# Altium schematic symbol library TI - ADC.SchLib: 2198 symbols (part 81 of 130) (continued)
## AFE5808ZCF (continued)
part D pins: A1 AVDD (power) "3.3V Analog supply for LNA, VCAT, PGA, LPF and CWD blocks.", C1 AVSS (power) "Analog ground.", D1 AVSS (power) "Analog ground.", D2 AVSS (power) "Analog ground.", D3 AVSS (power) "Analog ground.", D4 AVSS (power) "Analog ground.", D5 AVSS (power) "Analog ground.", D6 AVSS (power) "Analog ground.", D7 AVSS (power) "Analog ground.", D8 AVDD (power) "3.3V Analog supply for LNA, VCAT, PGA, LPF and CWD blocks.", D9 AVDD (power) "3.3V Analog supply for LNA, VCAT, PGA, LPF and CWD blocks.", E3 AVSS (power) "Analog ground.", E4 AVSS (power) "Analog ground.", E5 AVSS (power) "Analog ground.", E6 AVSS (power) "Analog ground.", E7 AVSS (power) "Analog ground.", E8 AVDD (power) "3.3V Analog supply for LNA, VCAT, PGA, LPF and CWD blocks.", E9 AVDD (power) "3.3V Analog supply for LNA, VCAT, PGA, LPF and CWD blocks.", F3 AVSS (power) "Analog ground.", F4 AVSS (power) "Analog ground.", F5 AVSS (power) "Analog ground.", F6 AVSS (power) "Analog ground.", F7 AVSS (power) "Analog ground.", G1 AVSS (power) "Analog ground.", G2 AVSS (power) "Analog ground.", G3 AVSS (power) "Analog ground.", G4 AVSS (power) "Analog ground.", G5 AVSS (power) "Analog ground.", G6 AVSS (power) "Analog ground.", G7 AVSS (power) "Analog ground.", H3 AVSS (power) "Analog ground.", H4 AVSS (power) "Analog ground.", H5 AVSS (power) "Analog ground.", H6 AVSS (power) "Analog ground.", H7 AVSS (power) "Analog ground.", J3 AVSS (power) "Analog ground.", J4 AVSS (power) "Analog ground.", J5 AVSS (power) "Analog ground.", J6 AVDD_ADC (power) "1.8V Analog power supply for ADC.", J7 AVDD_ADC (power) "1.8V Analog power supply for ADC.", K1 AVDD (power) "3.3V Analog supply for LNA, VCAT, PGA, LPF and CWD blocks.", K2 AVDD_5V (power) "5V Analog supply for LNA, VCAT, PGA, LPF and CWD blocks.", K6 AVSS (power) "Analog ground.", K7 DNC "Do not connect. Must leave floated", K8 AVDD_ADC (power) "1.8V Analog power supply for ADC.", L3 AVDD_ADC (power) "1.8V Analog power supply for ADC.", L5 DNC "Do not connect. Must leave floated", L6 DNC "Do not connect. Must leave floated", L7 DNC "Do not connect. Must leave floated", M1 AVDD_ADC (power) "1.8V Analog power supply for ADC.", M2 AVDD_ADC (power) "1.8V Analog power supply for ADC.", M5 DNC "Do not connect. Must leave floated", M6 DNC "Do not connect. Must leave floated", M7 DNC "Do not connect. Must leave floated", M8 DNC "Do not connect. Must leave floated", N3 DVDD (power) "ADC digital and I/O power supply, 1.8V", N4 DNC "Do not connect. Must leave floated", N5 DVSS (power) "ADC digital ground", N6 DNC "Do not connect. Must leave floated", N7 DVDD (power) "ADC digital and I/O power supply, 1.8V", P5 DVSS (power) "ADC digital ground", R5 DVSS (power) "ADC digital ground"

## AFE5851IRGCR
designator U?
16-Channel VGA with ADC, -40 to 85 degC, 64-pin QFN (RGC64), Green (RoHS & no Sb/Br); Manufacturer: Texas Instruments; PartNumber: AFE5851IRGCR; # Input Channels: 16; Analog Voltage AV/DD(Max)(V): 3.6; Analog Voltage AV/DD(Min)(V): 1.7; Digital Supply(Max)(V): 1.9; Resolution(Bits): 12; Sample Rate (max)(SPS): 65M; SFDR(dB): 55; SNR(dB): 66; SubFamily: High Speed ADC (>10MSPS); DatasheetVersion: SLOS574B; PackageVersion: 4204106/F, 11/2011; PackageReference: RGC64-7400X7400TP; PackageDescription: 64-Pin Plastic Quad Flatpack No-Lead, Body 9 x 9 mm, Pitch 0.5 mm; Supplier 1: Digi-Key; Supplier Part Number 1: ADS1210U/1KG4-ND; Digital Supply(Min)(V): 1.7; Eco-Plan: Green (RoHS & no Sb/Br); Mounting Technology: Surface Mount; ComponentLink1Description: Manufacturer URL; ComponentLink1URL: http://www.ti.com/; ComponentLink2Description: Datasheet; ComponentLink2URL: http://www.ti.com/general/docs/lit/getliterature.tsp?genericPartNumber=AFE5851&fileType=pdf; ComponentLink3Description: Package Specification; ComponentLink3URL: http://www.ti.com/litv/pdf/mpqf125e
footprint TI-RGC64-7400X7400TP_V (QFN, 64-Leads, Body 9x9mm, Pitch 0.5mm, Thermal Pad 7.4x7.4mm, TI Recommended)
part A pins: 1 IN1 (in) "Single-ended analog input pins for channel 1 to 16.", 2 IN2 (in) "Single-ended analog input pins for channel 1 to 16.", 3 IN3 (in) "Single-ended analog input pins for channel 1 to 16.", 4 IN4 (in) "Single-ended analog input pins for channel 1 to 16.", 5 IN5 (in) "Single-ended analog input pins for channel 1 to 16.", 6 IN6 (in) "Single-ended analog input pins for channel 1 to 16.", 7 IN7 (in) "Single-ended analog input pins for channel 1 to 16.", 8 IN8 (in) "Single-ended analog input pins for channel 1 to 16.", 9 IN9 (in) "Single-ended analog input pins for channel 1 to 16.", 10 IN10 (in) "Single-ended analog input pins for channel 1 to 16.", 11 IN11 (in) "Single-ended analog input pins for channel 1 to 16.", 12 IN12 (in) "Single-ended analog input pins for channel 1 to 16.", 13 IN13 (in) "Single-ended analog input pins for channel 1 to 16.", 14 IN14 (in) "Single-ended analog input pins for channel 1 to 16.", 15 IN15 (in) "Single-ended analog input pins for channel 1 to 16.", 16 IN16 (in) "Single-ended analog input pins for channel 1 to 16.", 17 VCM (out) "Common-mode output pins for possible bias of the analog input signals", 21 CLKINP (in) "Differential clock input pins. Single-ended clock is also supported. See the Clock Inputs section.", 22 CLKINM (in) "Differential clock input pins. Single-ended clock is also supported. See the Clock Inputs section.", 25 VREF_IN (in) "Reference input in the external reference mode", 26 NC "Do not connect", 27 NC "Do not connect", 31 D8M (hiz) "LVDS output for channels 1 and 2, 3 and 4, 5 and 6.... to 15 and 16.", 32 D8P (hiz) "LVDS output for channels 1 and 2, 3 and 4, 5 and 6.... to 15 and 16.", 33 D7M (hiz) "LVDS output for channels 1 and 2, 3 and 4, 5 and 6.... to 15 and 16.", 34 D7P (hiz) "LVDS output for channels 1 and 2, 3 and 4, 5 and 6.... to 15 and 16.", 35 D6M (hiz) "LVDS output for channels 1 and 2, 3 and 4, 5 and 6.... to 15 and 16.", 36 D6P (hiz) "LVDS output for channels 1 and 2, 3 and 4, 5 and 6.... to 15 and 16.", 37 D5M (hiz) "LVDS output for channels 1 and 2, 3 and 4, 5 and 6.... to 15 and 16.", 38 D5P (hiz) "LVDS output for channels 1 and 2, 3 and 4, 5 and 6.... to 15 and 16.", 39 FCLKM (out) "LVDS frame clock output", 40 FCLKP (out) "LVDS frame clock output", 41 DCLKM (out) "LVDS bit clock output", 42 DCLKP (out) "LVDS bit clock output", 43 D4M (hiz) "LVDS output for channels 1 and 2, 3 and 4, 5 and 6.... to 15 and 16.", 44 D4P (hiz) "LVDS output for channels 1 and 2, 3 and 4, 5 and 6.... to 15 and 16.", 45 D3M (hiz) "LVDS output for channels 1 and 2, 3 and 4, 5 and 6.... to 15 and 16.", 46 D3P (hiz) "LVDS output for channels 1 and 2, 3 and 4, 5 and 6.... to 15 and 16.", 47 D2M (hiz) "LVDS output for channels 1 and 2, 3 and 4, 5 and 6.... to 15 and 16.", 48 D2P (hiz) "LVDS output for channels 1 and 2, 3 and 4, 5 and 6.... to 15 and 16.", 49 D1M (hiz) "LVDS output for channels 1 and 2, 3 and 4, 5 and 6.... to 15 and 16.", 50 D1P (hiz) "LVDS output for channels 1 and 2, 3 and 4, 5 and 6.... to 15 and 16.", 53 SDOUT (out) "Serial interface data readout", 54 ~{SEN} (in) "Serial interface enable. 100kohm pullup resistor", 55 SDATA (in) "Serial interface data input. 100kohm pulldown resistor", 56 SCLK (in) "Serial interface clock input. 100kohm pulldown resistor", 57 RESET (in) "Hardware reset pin (active-high). 100kohm pulldown resistor", 58 SYNC (in) "TGC/VGA synchronization signal input. 100kohm pulldown resistor", 59 PDN (in) "Global power-down control input (active-high). 100kohm pulldown resistor", 60 NC "Do not connect", 64 VCM (out) "Common-mode output pins for possible bias of the analog input signals"
part B pins: 18 AVDD3 (power) "3.3V analog supply voltage", 19 AVDD18 (power) "1.8V analog supply voltage", 20 AVSS (power) "Analog ground", 23 AVSS (power) "Analog ground", 24 AVDD18 (power) "1.8V analog supply voltage", 28 DVDD18 (power) "1.8V LVDS buffer supply voltage", 29 DVSS (power) "Digital ground", 30 DVDD18 (power) "1.8V LVDS buffer supply voltage", 51 DVDD18 (power) "1.8V LVDS buffer supply voltage", 52 DVSS (power) "Digital ground", 61 AVSS (power) "Analog ground", 62 AVDD18 (power) "1.8V analog supply voltage", 63 AVSS (power) "Analog ground", 65 EP (power) "Connect to AVSS"

## AMC1200BDWVR
designator U?
IC ISOLATION AMP 60KHZ 8SOIC; Manufacturer: Texas Instruments; Number of Circuits: 1; Output Type: Differential; -3db Bandwidth: 100kHz; Voltage - Input Offset: 200µV; Current - Supply: 5.4mA; Current - Output / Channel: 20mA; Voltage - Supply, Single/Dual (±): 2.7 V ~ 5.5 V; Supplier 1: Digi-Key; Manufacturer Part Number: AMC1200BDWVR; RoHS: RoHS Compliant; Category: Integrated Circuits (ICs); Stock 1: 3983; Pricing 1: 1=5.41, 10=4.851, 100=3.9798, 500=3.3858, 1000=2.475 (USD); Packaging: Cut Tape (CT); Part Status: Active; Amplifier Type: Isolation; Slew Rate: -; Gain Bandwidth Product: -; Current - Input Bias: -; Operating Temperature: -40°C ~ 105°C; Mounting Type: Surface Mount; Package / Case: 8-SOIC (0.295", 7.50mm Width); Supplier Device Package: 8-SOIC; ComponentLink1URL: http://www.ti.com/lit/ds/symlink/amc1200.pdf; ComponentLink1Description: http://www.ti.com/lit/ds/symlink/amc1200.pdf; Value: AMC1200BDWVR; Supplier Part Number 1: 296-39898-1-ND
footprint SOIC8_5.8_7.5 (SOIC, 8-Leads, Body 5,85x7,50mm, Pitch 1,27mm, IPC Medium Density)
pins: 1 VDD1 (power) "High-side power supply", 2 VINP (in) "Noninverting analog input", 3 VINN (in) "Inverting analog input", 4 GND1 (power) "High-side analog ground", 5 GND2 (power) "Low-side analog ground", 6 VOUTN (out) "Inverting analog output", 7 VOUTP (out) "Noninverting analog output", 8 VDD2 (power) "Low-side power supply"

## AMC1200SDUB
designator U?
4 kV Peak Isolated Amplifier for Current Shunt Measurements, -40 to 125 degC, 8-pin SOP (DUB8), Green (RoHS & no Sb/Br); Manufacturer: Texas Instruments; PartNumber: AMC1200SDUB; # Input Channels: 1; Analog Voltage AV/DD(Max)(V): 5.5; Analog Voltage AV/DD(Min)(V): 4.5; Architecture: Delta-Sigma, Modulator; Digital Supply(Min)(V): 2.7; SubFamily: Isolated Precision ADC (<=10MSPS); DatasheetVersion: SBAS542B; PackageVersion: 4207614/C, 05/2006; PackageReference: DUB8; PackageDescription: 8-Pin Plastic Small Outline, Body 9.5 x 6.62 mm, Pitch 2.54 mm; Supplier 1: Digi-Key; Supplier Part Number 1: ADS1210UG4-ND; Digital Supply(Max)(V): 5.5; Eco-Plan: Green (RoHS & no Sb/Br); Mounting Technology: Surface Mount; ComponentLink1Description: Manufacturer URL; ComponentLink1URL: http://www.ti.com/; ComponentLink2Description: Datasheet; ComponentLink2URL: http://www.ti.com/general/docs/lit/getliterature.tsp?genericPartNumber=AMC1200&fileType=pdf; ComponentLink3Description: Package Specification; ComponentLink3URL: http://www.ti.com/lit/ml/mpds247b/mpds247b.pdf
footprint TI-DUB8_N (SOP, 8-Leads, Body 9.5x6.62mm, Pitch 2.54mm, IPC Medium Density)
footprint TI-DUB8_L (SOP, 8-Leads, Body 9.5x6.62mm, Pitch 2.54mm, IPC High Density)
footprint TI-DUB8_M (SOP, 8-Leads, Body 9.5x6.62mm, Pitch 2.54mm, IPC Low Density)
pins: 1 VDD1 (power) "High-side power supply", 2 VINP (in) "Noninverting analog input", 3 VINN (in) "Inverting analog input", 4 GND1 (power) "High-side analog ground", 5 GND2 (power) "Low-side analog ground", 6 VOUTN (out) "Inverting analog output", 7 VOUTP (out) "Noninverting analog output", 8 VDD2 (power) "Low-side power supply"

## AMC1200SDUBR
designator U?
4 kV Peak Isolated Amplifier for Current Shunt Measurements, -40 to 125 degC, 8-pin SOP (DUB8), Green (RoHS & no Sb/Br); Manufacturer: Texas Instruments; PartNumber: AMC1200SDUBR; # Input Channels: 1; Analog Voltage AV/DD(Max)(V): 5.5; Analog Voltage AV/DD(Min)(V): 4.5; Architecture: Delta-Sigma, Modulator; Digital Supply(Min)(V): 2.7; SubFamily: Isolated Precision ADC (<=10MSPS); DatasheetVersion: SBAS542B; PackageVersion: 4207614/C, 05/2006; PackageReference: DUB8; PackageDescription: 8-Pin Plastic Small Outline, Body 9.5 x 6.62 mm, Pitch 2.54 mm; Supplier 1: Digi-Key; Supplier Part Number 1: ADS800U-ND; Digital Supply(Max)(V): 5.5; Eco-Plan: Green (RoHS & no Sb/Br); Mounting Technology: Surface Mount; ComponentLink1Description: Manufacturer URL; ComponentLink1URL: http://www.ti.com/; ComponentLink2Description: Datasheet; ComponentLink2URL: http://www.ti.com/general/docs/lit/getliterature.tsp?genericPartNumber=AMC1200&fileType=pdf; ComponentLink3Description: Package Specification; ComponentLink3URL: http://www.ti.com/lit/ml/mpds247b/mpds247b.pdf
footprint TI-DUB8_N (SOP, 8-Leads, Body 9.5x6.62mm, Pitch 2.54mm, IPC Medium Density)
footprint TI-DUB8_L (SOP, 8-Leads, Body 9.5x6.62mm, Pitch 2.54mm, IPC High Density)
footprint TI-DUB8_M (SOP, 8-Leads, Body 9.5x6.62mm, Pitch 2.54mm, IPC Low Density)
pins: 1 VDD1 (power) "High-side power supply", 2 VINP (in) "Noninverting analog input", 3 VINN (in) "Inverting analog input", 4 GND1 (power) "High-side analog ground", 5 GND2 (power) "Low-side analog ground", 6 VOUTN (out) "Inverting analog output", 7 VOUTP (out) "Noninverting analog output", 8 VDD2 (power) "Low-side power supply"

## AMC1204DW
designator U?
1-Bit, 20 MHz, 2nd-Order, Isolated Delta-Sigma Modulator, -40 to 125 degC, 16-pin SOIC (DW16), Green (RoHS & no Sb/Br); Manufacturer: Texas Instruments; PartNumber: AMC1204DW; # Input Channels: 1; Analog Voltage AV/DD(Max)(V): 5.5; Analog Voltage AV/DD(Min)(V): 4.5; Architecture: Delta-Sigma, Modulator; Digital Supply(Min)(V): 3; INL(Max)(+/-LSB): 8; Interface: Serial; Resolution(Bits): 16; Sample Rate (max)(SPS): 78k; SFDR(dB): 96; SINAD(dB): 87; SNR(dB): 88; SubFamily: Isolated Precision ADC (<=10MSPS); DatasheetVersion: SBAS512C; PackageVersion: 4040000-2/G, 01/2011; PackageReference: DW16; PackageDescription: 16-Pin Plastic Small Outline, Body 10.30 x 7.50 mm, Pitch 1.27 mm; Supplier 1: Digi-Key; Supplier Part Number 1: ADS800U/1K-ND; Digital Supply(Max)(V): 5.5; Eco-Plan: Green (RoHS & no Sb/Br); Mounting Technology: Surface Mount; Code_JEDEC: MS-013; ComponentLink1Description: Manufacturer URL; ComponentLink1URL: http://www.ti.com/; ComponentLink2Description: Datasheet; ComponentLink2URL: http://www.ti.com/general/docs/lit/getliterature.tsp?genericPartNumber=AMC1204&fileType=pdf; ComponentLink3Description: Package Specification; ComponentLink3URL: http://www.ti.com/litv/pdf/msoi003g
footprint TI-DW16_N (SOIC, 16-Leads, Body 10.3x7.5mm, Pitch 1.27mm, IPC Medium Density)
footprint TI-DW16_L (SOIC, 16-Leads, Body 10.3x7.5mm, Pitch 1.27mm, IPC High Density)
footprint TI-DW16_M (SOIC, 16-Leads, Body 10.3x7.5mm, Pitch 1.27mm, IPC Low Density)
part A pins: 1 AVDD (power) "High-side power supply", 2 VINP (in) "Noninverting analog input", 3 VINN (in) "Inverting analog input", 4 AGND (power) "High-side ground", 8 AGND (power) "High-side ground", 9 DGND (power) "Controller-side ground", 11 DATA (hiz) "Modulator data output", 13 CLKIN (in) "Modulator clock input", 14 DVDD (power) "Controller-side power supply", 16 DGND (power) "Controller-side ground"
part B pins: 5 NC "No internal connection; can be tied to any potential or left unconnected", 6 NC "No internal connection; can be tied to any potential or left unconnected", 7 NC "No internal connection; can be tied to any potential or left unconnected", 10 NC "No internal connection; can be tied to any potential or left unconnected", 12 NC "No internal connection; can be tied to any potential or left unconnected", 15 NC "No internal connection; can be tied to any potential or left unconnected"

## AMC1204DWR
designator U?
1-Bit, 20 MHz, 2nd-Order, Isolated Delta-Sigma Modulator, -40 to 125 degC, 16-pin SOIC (DW16), Green (RoHS & no Sb/Br); Manufacturer: Texas Instruments; PartNumber: AMC1204DWR; # Input Channels: 1; Analog Voltage AV/DD(Max)(V): 5.5; Analog Voltage AV/DD(Min)(V): 4.5; Architecture: Delta-Sigma, Modulator; Digital Supply(Min)(V): 3; INL(Max)(+/-LSB): 8; Interface: Serial; Resolution(Bits): 16; Sample Rate (max)(SPS): 78k; SFDR(dB): 96; SINAD(dB): 87; SNR(dB): 88; SubFamily: Isolated Precision ADC (<=10MSPS); DatasheetVersion: SBAS512C; PackageVersion: 4040000-2/G, 01/2011; PackageReference: DW16; PackageDescription: 16-Pin Plastic Small Outline, Body 10.30 x 7.50 mm, Pitch 1.27 mm; Supplier 1: Digi-Key; Supplier Part Number 1: ADS800U/1KG4-ND; Digital Supply(Max)(V): 5.5; Eco-Plan: Green (RoHS & no Sb/Br); Mounting Technology: Surface Mount; Code_JEDEC: MS-013; ComponentLink1Description: Manufacturer URL; ComponentLink1URL: http://www.ti.com/; ComponentLink2Description: Datasheet; ComponentLink2URL: http://www.ti.com/general/docs/lit/getliterature.tsp?genericPartNumber=AMC1204&fileType=pdf; ComponentLink3Description: Package Specification; ComponentLink3URL: http://www.ti.com/litv/pdf/msoi003g
footprint TI-DW16_N (SOIC, 16-Leads, Body 10.3x7.5mm, Pitch 1.27mm, IPC Medium Density)
footprint TI-DW16_L (SOIC, 16-Leads, Body 10.3x7.5mm, Pitch 1.27mm, IPC High Density)
footprint TI-DW16_M (SOIC, 16-Leads, Body 10.3x7.5mm, Pitch 1.27mm, IPC Low Density)
part A pins: 1 AVDD (power) "High-side power supply", 2 VINP (in) "Noninverting analog input", 3 VINN (in) "Inverting analog input", 4 AGND (power) "High-side ground", 8 AGND (power) "High-side ground", 9 DGND (power) "Controller-side ground", 11 DATA (hiz) "Modulator data output", 13 CLKIN (in) "Modulator clock input", 14 DVDD (power) "Controller-side power supply", 16 DGND (power) "Controller-side ground"
part B pins: 5 NC "No internal connection; can be tied to any potential or left unconnected", 6 NC "No internal connection; can be tied to any potential or left unconnected", 7 NC "No internal connection; can be tied to any potential or left unconnected", 10 NC "No internal connection; can be tied to any potential or left unconnected", 12 NC "No internal connection; can be tied to any potential or left unconnected", 15 NC "No internal connection; can be tied to any potential or left unconnected"

## AMC1204QDWRQ1
designator U?
Automotive Catalog, 1-Bit, 20 MHz, 2nd-Order, Isolated Delta-Sigma Modulator, -40 to 125 degC, 16-pin SOIC (DW16), Green (RoHS & no Sb/Br); Manufacturer: Texas Instruments; PartNumber: AMC1204QDWRQ1; # Input Channels: 1; Analog Voltage AV/DD(Max)(V): 5.5; Analog Voltage AV/DD(Min)(V): 4.5; Architecture: Delta-Sigma, Modulator; Digital Supply(Min)(V): 2.7; INL(Max)(+/-LSB): 16; Interface: Serial; Sample Rate(max)(SPS): 78k; SFDR(dB): 96; SINAD(dB): 87; SNR(dB): 88; SubFamily: Isolated ADC; DatasheetVersion: SLAS886B; PackageVersion: 4040000-2/G, 01/2011; PackageReference: DW16; PackageDescription: 16-Pin Plastic Small Outline, Body 10.30 x 7.50 mm, Pitch 1.27 mm; Supplier 1: Digi-Key; Supplier Part Number 1: ADS800UG4-ND; Digital Supply(Max)(V): 5.5; Eco-Plan: Green (RoHS & no Sb/Br); Resolution(Bits): 16; Mounting Technology: Surface Mount; Code_JEDEC: MS-013; ComponentLink1Description: Manufacturer URL; ComponentLink1URL: http://www.ti.com/; ComponentLink2Description: Datasheet; ComponentLink2URL: http://www.ti.com/lit/ds/symlink/amc1204-q1.pdf; ComponentLink3Description: Package Specification; ComponentLink3URL: http://www.ti.com/litv/pdf/msoi003g
footprint TI-DW16_N (SOIC, 16-Leads, Body 10.3x7.5mm, Pitch 1.27mm, IPC Medium Density)
footprint TI-DW16_L (SOIC, 16-Leads, Body 10.3x7.5mm, Pitch 1.27mm, IPC High Density)
footprint TI-DW16_M (SOIC, 16-Leads, Body 10.3x7.5mm, Pitch 1.27mm, IPC Low Density)
part A pins: 1 AVDD (power) "High-side power supply", 2 VINP (in) "Noninverting analog input", 3 VINN (in) "Inverting analog input", 4 AGND (power) "High-side ground", 8 AGND (power) "High-side ground", 9 DGND (power) "Controller-side ground", 11 DATA (hiz) "Modulator data output", 13 CLKIN (in) "Modulator clock input", 14 DVDD (power) "Controller-side power supply", 16 DGND (power) "Controller-side ground"
part B pins: 5 NC "No internal connection; can be tied to any potential or left unconnected", 6 NC "No internal connection; can be tied to any potential or left unconnected", 7 NC "No internal connection; can be tied to any potential or left unconnected", 10 NC "No internal connection; can be tied to any potential or left unconnected", 12 NC "No internal connection; can be tied to any potential or left unconnected", 15 NC "No internal connection; can be tied to any potential or left unconnected"

## AMC7812SPAP
designator U?
Integrated, Multichannel ADC and DAC for Analog Monitoring & Control, -40 to 105 degC, 64-pin QFP (PAP64), Green (RoHS & no Sb/Br); Manufacturer: Texas Instruments; PartNumber: AMC7812SPAP; # Input Channels: 16; Analog Voltage AV/DD(Max)(V): 5.5; Analog Voltage AV/DD(Min)(V): 2.7; INL(Max)(+/-LSB): 1; Resolution(Bits): 12; Sample Rate (max)(SPS): 500; SubFamily: Precision ADC (<=10MSPS); DatasheetVersion: SBAS513D; PackageVersion: 4147702/C, 08/2003; PackageReference: PAP64-6495X6495TP; PackageDescription: 64-Pin PowerPAD(TM) Plastic Quad Flatpack, Body 10 x 10 mm, Pitch 0.5 mm; Supplier 1: Digi-Key; Supplier Part Number 1: ADS821U-ND; Digital Supply(Max)(V): 5.5; Digital Supply(Min)(V): 2.7; Eco-Plan: Green (RoHS & no Sb/Br); Mounting Technology: Surface Mount; Code_JEDEC: MS-026; ComponentLink1Description: Manufacturer URL; ComponentLink1URL: http://www.ti.com/; ComponentLink2Description: Datasheet; ComponentLink2URL: http://www.ti.com/general/docs/lit/getliterature.tsp?genericPartNumber=AMC7812&fileType=pdf; ComponentLink3Description: Package Specification; ComponentLink3URL: http://www.ti.com/lit/ml/mpqf071b/mpqf071b.pdf
footprint TI-PAP64-6495X6495TP_N (QFP, 64-Leads, Body 10x10mm, Pitch 0.5mm, Thermal Pad 7x7mm, IPC Medium Density)
footprint TI-PAP64-6495X6495TP_L (QFP, 64-Leads, Body 10x10mm, Pitch 0.5mm, Thermal Pad 7x7mm, IPC High Density)
footprint TI-PAP64-6495X6495TP_M (QFP, 64-Leads, Body 10x10mm, Pitch 0.5mm, Thermal Pad 7x7mm, IPC Low Density)
pins: 1 ~{RESET} (in) "Reset input, active low. Logic low on this pin causes the device to perform a hardware reset.", 2 ~{DAV} (out) "Data available indicator, active low output. In direct mode, the D\A\V\ pin goes low (active) when the conversion ends. In auto mode, a 1us pulse (active low) appears on this pin when a conversion cycle finishes (see the (See Datasheet)", 3 ~{CNVT} (in) "External conversion trigger, active low. The falling edge starts the sampling and conversion of the ADC.", 4 SDI/SDA (io) "Serial interface data. SDI for the serial peripheral interface (SPI) when the SPI/I2C pin is high. SDA for I2 C when the SPI/I2C pin is low.", 5 SCLK/SCL (in) "Serial clock input of the main serial interface. SPI clock when the SPI/I2C pin is high; I2C clock when the SPI/I2C pin is low.", 6 DGND (power) "Digital ground", 7 IOVDD (power) "Interface power supply", 8 DVDD (power) "Digital power supply (+3V to +5V). Must be the same value as AVDD.", 9 ~{CS}/A0 (in) "Chip select signal for SPI when the SPI/I2C pin is high. Slave address selection A0 for I2C when the SPI/I2C pin is low.", 10 SDO/A1 (io) "SDO for SPI when the SPI/I2C pin is high. Slave address selection A1 for I2C when the SPI/I2C pin is low.", 11 A2 (in) "Slave address selection A2 for I2C when the SPI/I2C pin is low.", 12 SPI/I2C (in) "Interface selection pin. Digital input. When this pin is tied to IOVDD, the SPI is enabled and the I2C interface is disabled. When this pin is tied to ground, the SPI is disabled and the I2C interface is enabled.", 13 GPIO-0 (io) "General-purpose digital input/output. This pin is a bidirectional open-drain, digital input/output, and requires an external pull-up resistor. See the General Purpose Input/Output Pins section for more details.", 14 GPIO-1 (io) "General-purpose digital input/output. This pin is a bidirectional open-drain, digital input/output, and requires an external pull-up resistor. See the General Purpose Input/Output Pins section for more details.", 15 GPIO-2 (io) "General-purpose digital input/output. This pin is a bidirectional open-drain, digital input/output, and requires an external pull-up resistor. See the General Purpose Input/Output Pins section for more details.", 16 GPIO-3 (io) "General-purpose digital input/output. This pin is a bidirectional open-drain, digital input/output, and requires an external pull-up resistor. See the General Purpose Input/Output Pins section for more details.", 17 ~{DAC-CLR-0} (in) "DAC clear control signal, digital input, active low. When low, all DACs associated with the DAC-CLR-0 pin enter a clear state, the DAC Latch is loaded with predefined code, and the output is set to the corresponding level. (See Datasheet)", 18 DAC5-OUT (hiz) "Output of DAC channels 5", 19 DAC4-OUT (hiz) "Output of DAC channels 4", 20 DAC3-OUT (hiz) "Output of DAC channels 3", 21 AGND4 (power) "Analog ground", 22 AGND3 (power) "Analog ground", 23 AVCC2 (power) "Positive analog power for DAC0-OUT, DAC1-OUT, DAC2-OUT, DAC3-OUT, DAC4-OUT, DAC5-OUT, must be tied to AVCC1", 24 DAC2-OUT (hiz) "Output of DAC channels 2", 25 DAC1-OUT (hiz) "Output of DAC channels 1", 26 DAC0-OUT (hiz) "Output of DAC channels 0", 27 D2-/GPIO-6 (io) "Remote sensor D2 negative input when D2 enabled; GPIO-6 when D2 disabled. Pull-up required for output.", 28 D2+/GPIO-7 (io) "Remote sensor D2 positive input when D2 enabled; GPIO-7 when D2 disabled. Pull-up required for output.", 29 D1-/GPIO-4 (io) "Remote sensor D1 negative input when D1 enabled; GPIO-6 when D1 disabled. Pull-up required for output.", 30 D1+/GPIO-5 (io) "Remote sensor D1 positive input when D1 enabled; GPIO-7 when D1 disabled. Pull-up required for output.", 31 ADC-REF-IN/CMP (in) "External ADC reference input when external VREF is used to drive ADC. Compensation capacitor connection (connect 4.7uF capacitor between this pin and AGND) when Internal VREF is used to drive ADC.", 32 ADC-GND (power) "ADC ground. Must be connected to AGND.", 33 CH0 (in) "Analog inputs of channel 0 to 15. CH4 to CH15 are single-ended. CH0, CH1, CH2, and CH3 can be programmed as differential or single-ended.", 34 CH1 (in) "Analog inputs of channel 0 to 15. CH4 to CH15 are single-ended. CH0, CH1, CH2, and CH3 can be programmed as differential or single-ended.", 35 CH2 (in) "Analog inputs of channel 0 to 15. CH4 to CH15 are single-ended. CH0, CH1, CH2, and CH3 can be programmed as differential or single-ended.", 36 CH3 (in) "Analog inputs of channel 0 to 15. CH4 to CH15 are single-ended. CH0, CH1, CH2, and CH3 can be programmed as differential or single-ended.", 37 CH4 (in) "Analog inputs of channel 0 to 15. CH4 to CH15 are single-ended. CH0, CH1, CH2, and CH3 can be programmed as differential or single-ended.", 38 CH5 (in) "Analog inputs of channel 0 to 15. CH4 to CH15 are single-ended. CH0, CH1, CH2, and CH3 can be programmed as differential or single-ended.", 39 CH6 (in) "Analog inputs of channel 0 to 15. CH4 to CH15 are single-ended. CH0, CH1, CH2, and CH3 can be programmed as differential or single-ended.", 40 CH7 (in) "Analog inputs of channel 0 to 15. CH4 to CH15 are single-ended. CH0, CH1, CH2, and CH3 can be programmed as differential or single-ended.", 41 CH8 (in) "Analog inputs of channel 0 to 15. CH4 to CH15 are single-ended. CH0, CH1, CH2, and CH3 can be programmed as differential or single-ended.", 42 CH9 (in) "Analog inputs of channel 0 to 15. CH4 to CH15 are single-ended. CH0, CH1, CH2, and CH3 can be programmed as differential or single-ended.", 43 CH10 (in) "Analog inputs of channel 0 to 15. CH4 to CH15 are single-ended. CH0, CH1, CH2, and CH3 can be programmed as differential or single-ended.", 44 CH11 (in) "Analog inputs of channel 0 to 15. CH4 to CH15 are single-ended. CH0, CH1, CH2, and CH3 can be programmed as differential or single-ended.", 45 CH12 (in) "Analog inputs of channel 0 to 15. CH4 to CH15 are single-ended. CH0, CH1, CH2, and CH3 can be programmed as differential or single-ended.", 46 CH13 (in) "Analog inputs of channel 0 to 15. CH4 to CH15 are single-ended. CH0, CH1, CH2, and CH3 can be programmed as differential or single-ended.", 47 CH14 (in) "Analog inputs of channel 0 to 15. CH4 to CH15 are single-ended. CH0, CH1, CH2, and CH3 can be programmed as differential or single-ended.", 48 CH15 (in) "Analog inputs of channel 0 to 15. CH4 to CH15 are single-ended. CH0, CH1, CH2, and CH3 can be programmed as differential or single-ended.", 49 AVDD1 (power) "Positive analog power supply", 50 AVDD2 (power) "Positive analog power supply", 51 DAC6-OUT (hiz) "Output of DAC channels 6", 52 DAC7-OUT (hiz) "Output of DAC channels 7", 53 DAC8-OUT (hiz) "Output of DAC channels 8", 54 AGND1 (power) "Analog ground", 55 AGND2 (power) "Analog ground", 56 AVCC1 (power) "Positive analog power for DAC6-OUT, DAC7-OUT, DAC8-OUT, DAC9-OUT, DAC10-OUT, DAC11-OUT, must be tied to AVCC2", 57 REF-OUT (out) "Internal reference output", 58 REF-DAC (in) "DAC reference Input", 59 DAC9-OUT (hiz) "Output of DAC channels 9", 60 DAC10-OUT (hiz) "Output of DAC channels 10", 61 DAC11-OUT (hiz) "Output of DAC channels 11", 62 ~{ALARM} (hiz) "Global alarm. Open drain output. External 10kohm pull-up resistor required. This pin goes low (active) when one (or more) of the analog channels are out of range.", 63 ~{DAC-CLR-1} (in) "DAC clear control signal, digital input, active low. When low, all DACs associated with the DAC-CLR-1 pin enter a clear state, the DAC Latch is loaded with predefined code, and the output is set to the corresponding level. (See Datasheet)", 64 DGND2 (power) "Digital ground", 65 EP

## DDC112U
designator U?
Dual Current Input 20-Bit ADC, -40 to 85 degC, 28-pin SOIC (DW28), Green (RoHS & no Sb/Br); Manufacturer: Texas Instruments; PartNumber: DDC112U; # Input Channels: 2; Analog Voltage AV/DD(Max)(V): 5.25; Analog Voltage AV/DD(Min)(V): 4.75; Architecture: Delta-Sigma; Resolution(Bits): 20; Sample Rate (max)(SPS): 3k; SubFamily: Current Input ADC; DatasheetVersion: SBAS085B; PackageVersion: 4040000-6/G, 01/2011; PackageReference: DW28; PackageDescription: 28-Pin Plastic Small Outline, Body 17.90 x 7.50 mm, Pitch 1.27 mm; Supplier 1: Digi-Key; Supplier Part Number 1: ADS821UG4-ND; Digital Supply(Max)(V): 5.25; Digital Supply(Min)(V): 4.75; Eco-Plan: Green (RoHS & no Sb/Br); Mounting Technology: Surface Mount; Code_JEDEC: MS-013; ComponentLink1Description: Manufacturer URL; ComponentLink1URL: http://www.ti.com/; ComponentLink2Description: Datasheet; ComponentLink2URL: http://www.ti.com/general/docs/lit/getliterature.tsp?genericPartNumber=DDC112&fileType=pdf; ComponentLink3Description: Package Specification; ComponentLink3URL: http://www.ti.com/lit/ml/mpds175a/mpds175a.pdf
footprint TI-DW28_N (SOIC, 28-Leads, Body 17.9x7.5mm, Pitch 1.27mm, IPC Medium Density)
footprint TI-DW28_L (SOIC, 28-Leads, Body 17.9x7.5mm, Pitch 1.27mm, IPC High Density)
footprint TI-DW28_M (SOIC, 28-Leads, Body 17.9x7.5mm, Pitch 1.27mm, IPC Low Density)
pins: 1 IN1 (in) "Input 1: analog input for Integrators 1A and 1B. The integrator that is active is set by the CONV input.", 2 AGND (power) "Analog Ground", 3 CAP1B "External Capacitor for Integrator 1B", 4 CAP1B "External Capacitor for Integrator 1B", 5 CAP1A "External Capacitor for Integrator 1A", 6 CAP1A "External Capacitor for Integrator 1A", 7 AVDD (power) "Analog Supply, +5V Nominal", 8 TEST (in) "Test Control Input. When HIGH, a test charge is applied to the A or B integrators on the next CONV transition.", 9 CONV (in) "Controls which side of the integrator is connected to input. In continuous mode; CONV HIGH ¡ú side A is integrating, CONV LOW ¡ú side B is integrating. CONV must be synchronized with CLK (see Figure 2).", 10 CLK (in) "System Clock Input, 10MHz Nominal", 11 DCLK (in) "Serial Data Clock Input. This input operates the serial I/ O shift register.", 12 ~{DXMIT} (in) "Serial Data Transmit Enable Input. When LOW, this input enables the internal serial shift register.", 13 DIN (in) "Serial Digital Input. Used to cascade multiple DDC112s.", 14 DVDD (power) "Digital Supply, +5V Nominal", 15 DGND (power) "Digital Ground", 16 DOUT (hiz) "Serial Data Output, Hi-Z when D\X\M\I\T\ is HIGH", 17 ~{DVALID} (out) "Data Valid Output. A LOW value indicates valid data is available in the serial I/O register.", 18 RANGE0 (in) "Range Control Input 0 (least significant bit)", 19 RANGE1 (in) "Range Control Input 1", 20 RANGE2 (in) "Range Control Input 2 (most significant bit)", 21 AGND (power) "Analog Ground", 22 VREF (in) "External Reference Input, +4.096V Nominal", 23 CAP2A "External Capacitor for Integrator 2A", 24 CAP2A "External Capacitor for Integrator 2A", 25 CAP2B "External Capacitor for Integrator 2B", 26 CAP2B "External Capacitor for Integrator 2B", 27 AGND (power) "Analog Ground", 28 IN2 (in) "Input 2: analog input for Integrators 2A and 2B. The integrator that is active is set by the CONV input."